# Altium footprint library ICs And Semiconductors SMD.PcbLib: 943 footprints (part 7 of 60)
Each footprint in its own frame and in the unit in brackets; x right, y up, seen from the top. Pads: shape width x height; smd on the part's side, far side on the other; paste and mask are expansions set on the pad; w line width, h text height; cw(c..) or ccw(c..) is an arc to the next point about the centre after c.
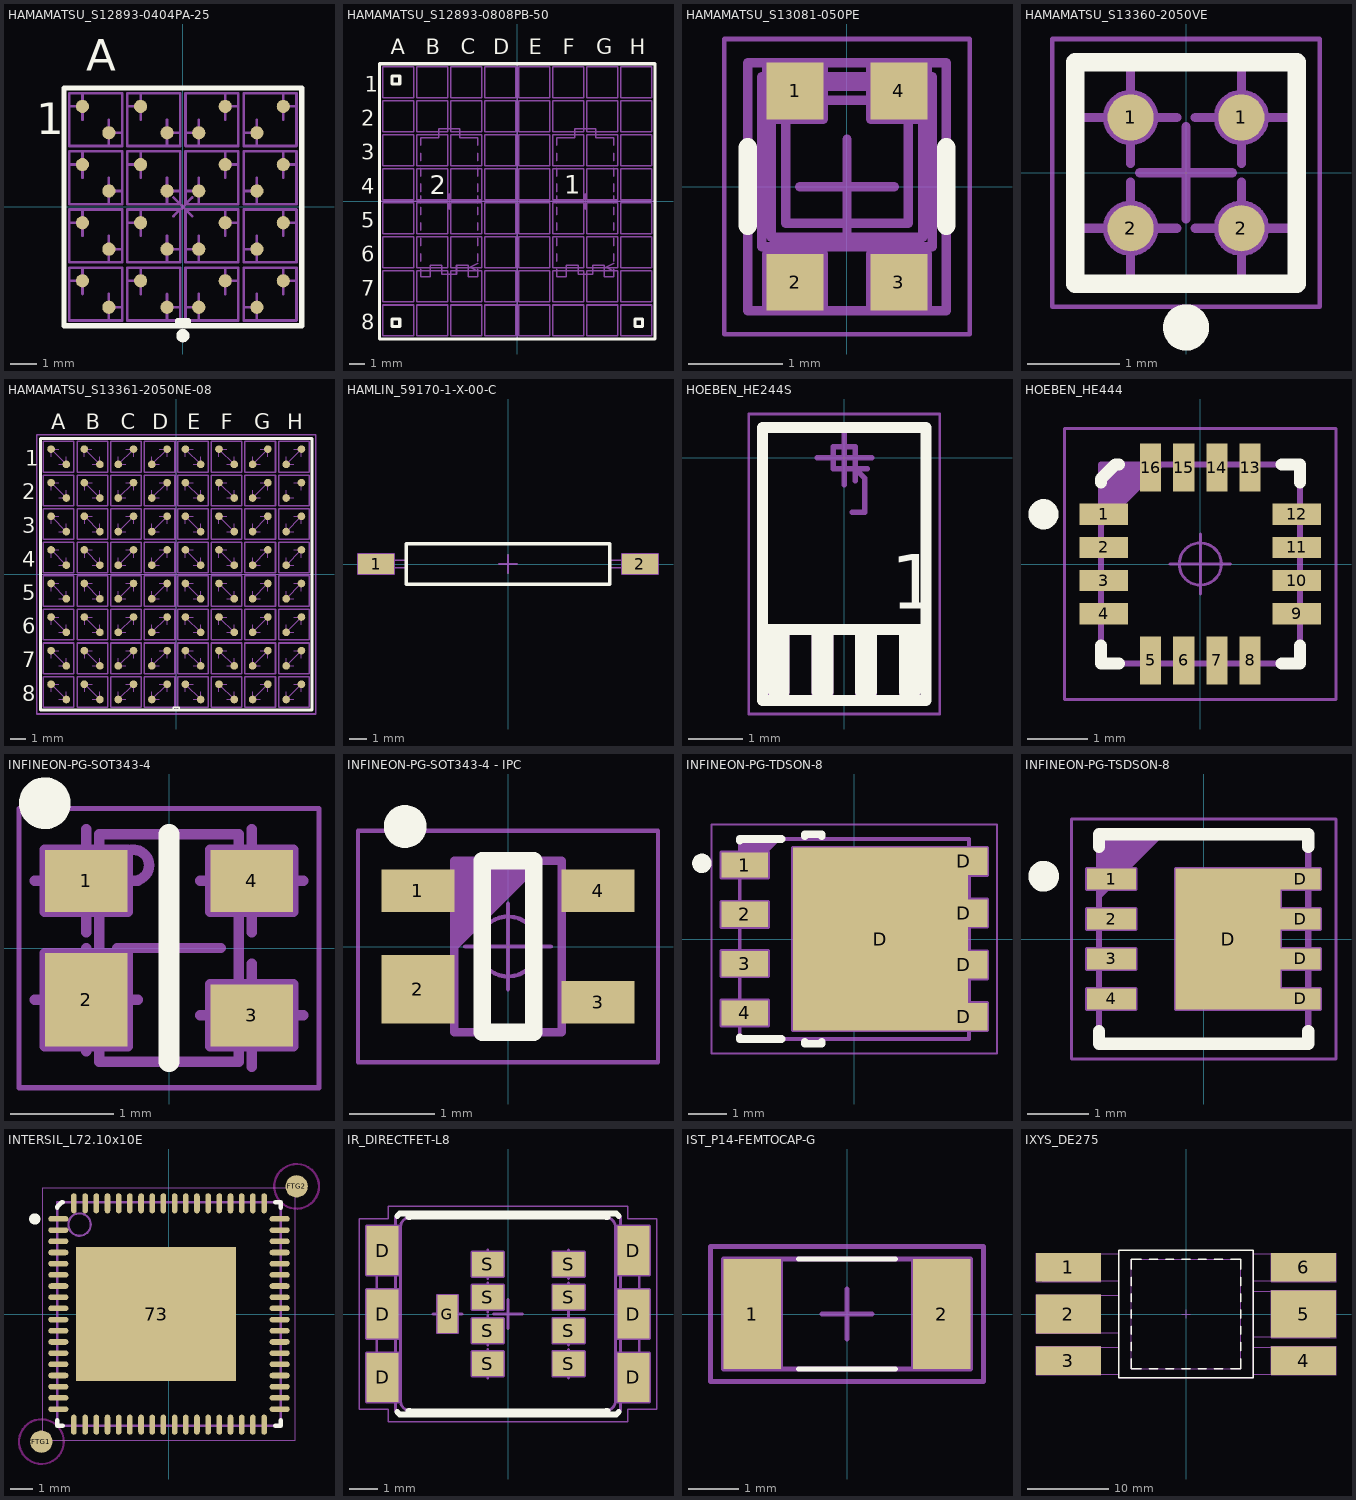
[diagram p6: the footprints below, top view; thin cyan lines are the x and y axes]

## HAMAMATSU_S12893-0404PA-25 [mm] "2X2mm, 16 Channel (4x4) TSV MPPC (Multi-Pixel Photon Counter), Body 9 x 9 x 1.55mm"
height 1.55
pads (32):
  round 0.5 smd: AA1(-3.8,3.8) AA2(-3.8,1.6) AA3(-3.8,-0.6) AA4(-3.8,-2.8) AB1(-1.6,3.8) AB2(-1.6,1.6) AB3(-1.6,-0.6) AB4(-1.6,-2.8) AC1(1.6,3.8) AC2(1.6,1.6) AC3(1.6,-0.6) AC4(1.6,-2.8) AD1(3.8,3.8) AD2(3.8,1.6) AD3(3.8,-0.6) AD4(3.8,-2.8) KA1(-2.8,2.8) KA2(-2.8,0.6) KA3(-2.8,-1.6) KA4(-2.8,-3.8) KB1(-0.6,2.8) KB2(-0.6,0.6) KB3(-0.6,-1.6) KB4(-0.6,-3.8) KC1(0.6,2.8) KC2(0.6,0.6) KC3(0.6,-1.6) KC4(0.6,-3.8) KD1(2.8,2.8) KD2(2.8,0.6) KD3(2.8,-1.6) KD4(2.8,-3.8)
Top Overlay:
  circle w0.25: c0,-4.875 r0.125
  lines w0.2: -0.2,-4.4 0.2,-4.4 ; -4.5,-4.5 4.5,-4.5 4.5,4.5 -4.5,4.5 -4.5,-4.5 ; -0.2,-4.5 0.2,-4.5 0.2,-4.3 -0.2,-4.3 -0.2,-4.5
  text "1" at -5.55,2.75 h1.2
  text "A" at -3.665,5.15 h1.2
Mechanical 8:
  lines w0.1: -4.3,-2.8 -3.8,-2.8 ; -4.3,-0.6 -3.8,-0.6 ; -4.3,1.6 -3.8,1.6 ; -4.3,3.8 -3.8,3.8 ; -3.8,-3.3 -3.8,-2.8 ; -3.8,-2.3 -3.8,-2.8 ; -3.8,-1.1 -3.8,-0.6 ; -3.8,-0.1 -3.8,-0.6 ; -3.8,1.1 -3.8,1.6 ; -3.8,2.1 -3.8,1.6 ; -3.8,3.3 -3.8,3.8 ; -3.8,4.3 -3.8,3.8 ; -2.8,-4.3 -2.8,-3.8 ; -2.8,-3.3 -2.8,-3.8 ; -2.8,-2.1 -2.8,-1.6 ; -2.8,-1.1 -2.8,-1.6 ; -2.8,0.1 -2.8,0.6 ; -2.8,1.1 -2.8,0.6 ; -2.8,2.3 -2.8,2.8 ; -2.8,3.3 -2.8,2.8 ; -2.3,-3.8 -2.8,-3.8 ; -2.3,-1.6 -2.8,-1.6 ; -2.3,0.6 -2.8,0.6 ; -2.3,2.8 -2.8,2.8 ; -2.1,-2.8 -1.6,-2.8 ; -2.1,-0.6 -1.6,-0.6 ; -2.1,1.6 -1.6,1.6 ; -2.1,3.8 -1.6,3.8 ; -1.6,-3.3 -1.6,-2.8 ; -1.6,-2.3 -1.6,-2.8 ; -1.6,-1.1 -1.6,-0.6 ; -1.6,-0.1 -1.6,-0.6 ; -1.6,1.1 -1.6,1.6 ; -1.6,2.1 -1.6,1.6 ; -1.6,3.3 -1.6,3.8 ; -1.6,4.3 -1.6,3.8 ; -0.6,-4.3 -0.6,-3.8 ; -0.6,-3.3 -0.6,-3.8 ; -0.6,-2.1 -0.6,-1.6 ; -0.6,-1.1 -0.6,-1.6 ; -0.6,0.1 -0.6,0.6 ; -0.6,1.1 -0.6,0.6 ; -0.6,2.3 -0.6,2.8 ; -0.6,3.3 -0.6,2.8 ; -0.354,-0.354 0,0 ; -0.354,0.354 0,0 ; -0.1,-3.8 -0.6,-3.8 ; -0.1,-1.6 -0.6,-1.6 ; -0.1,0.6 -0.6,0.6 ; -0.1,2.8 -0.6,2.8 ; 0.1,-3.8 0.6,-3.8 ; 0.1,-1.6 0.6,-1.6 ; 0.1,0.6 0.6,0.6 ; 0.1,2.8 0.6,2.8 ; 0.354,-0.354 0,0 ; 0.354,0.354 0,0 ; 0.6,-4.3 0.6,-3.8 ; 0.6,-3.3 0.6,-3.8 ; 0.6,-2.1 0.6,-1.6 ; 0.6,-1.1 0.6,-1.6 ; 0.6,0.1 0.6,0.6 ; 0.6,1.1 0.6,0.6 ; 0.6,2.3 0.6,2.8 ; 0.6,3.3 0.6,2.8 ; 1.6,-3.3 1.6,-2.8 ; 1.6,-2.3 1.6,-2.8 ; 1.6,-1.1 1.6,-0.6 ; 1.6,-0.1 1.6,-0.6 ; 1.6,1.1 1.6,1.6 ; 1.6,2.1 1.6,1.6 ; 1.6,3.3 1.6,3.8 ; 1.6,4.3 1.6,3.8 ; 2.1,-2.8 1.6,-2.8 ; 2.1,-0.6 1.6,-0.6 ; 2.1,1.6 1.6,1.6 ; 2.1,3.8 1.6,3.8 ; 2.3,-3.8 2.8,-3.8 ; 2.3,-1.6 2.8,-1.6 ; 2.3,0.6 2.8,0.6 ; 2.3,2.8 2.8,2.8 ; 2.8,-4.3 2.8,-3.8 ; 2.8,-3.3 2.8,-3.8 ; 2.8,-2.1 2.8,-1.6 ; 2.8,-1.1 2.8,-1.6 ; 2.8,0.1 2.8,0.6 ; 2.8,1.1 2.8,0.6 ; 2.8,2.3 2.8,2.8 ; 2.8,3.3 2.8,2.8 ; 3.8,-3.3 3.8,-2.8 ; 3.8,-2.3 3.8,-2.8 ; 3.8,-1.1 3.8,-0.6 ; 3.8,-0.1 3.8,-0.6 ; 3.8,1.1 3.8,1.6 ; 3.8,2.1 3.8,1.6 ; 3.8,3.3 3.8,3.8 ; 3.8,4.3 3.8,3.8 ; 4.3,-2.8 3.8,-2.8 ; 4.3,-0.6 3.8,-0.6 ; 4.3,1.6 3.8,1.6 ; 4.3,3.8 3.8,3.8
  text "K(A-1)" at -4.211,2.7 h0.2
  text "A(A-1)" at -3.4,3.7 h0.2
  text "K(B-1)" at -1.991,2.7 h0.2
  text "A(B-1)" at -1.2,3.7 h0.2
  text "K(C-1)" at 1.029,2.7 h0.2
  text "A(C-1)" at 0.158,3.7 h0.2
  text "K(D-1)" at 3.229,2.7 h0.2
  text "A(D-1)" at 2.338,3.7 h0.2
  text "K(A-2)" at -4.251,0.5 h0.2
  text "A(A-2)" at -3.4,1.5 h0.2
  text "K(B-2)" at -2.031,0.5 h0.2
  text "A(B-2)" at -1.2,1.5 h0.2
  text "K(C-2)" at 1.029,0.5 h0.2
  text "A(C-2)" at 0.118,1.5 h0.2
  text "K(D-2)" at 3.229,0.5 h0.2
  text "A(D-2)" at 2.298,1.5 h0.2
  text "K(A-3)" at -4.251,-1.7 h0.2
  text "A(A-3)" at -3.4,-0.7 h0.2
  text "K(B-3)" at -2.031,-1.7 h0.2
  text "A(B-3)" at -1.2,-0.7 h0.2
  text "K(C-3)" at 1.029,-1.7 h0.2
  text "A(C-3)" at 0.118,-0.7 h0.2
  text "K(D-3)" at 3.229,-1.7 h0.2
  text "A(D-3)" at 2.298,-0.7 h0.2
  text "K(A-4)" at -4.271,-3.9 h0.2
  text "A(A-4)" at -3.4,-2.9 h0.2
  text "K(B-4)" at -2.051,-3.9 h0.2
  text "A(B-4)" at -1.2,-2.9 h0.2
  text "K(C-4)" at 1.029,-3.9 h0.2
  text "A(C-4)" at 0.098,-2.9 h0.2
  text "K(D-4)" at 3.229,-3.9 h0.2
  text "A(D-4)" at 2.278,-2.9 h0.2
Mechanical 14:
  lines w0.1: -0.2,-4.4 0.2,-4.4 ; -4.5,-4.5 4.5,-4.5 4.5,4.5 -4.5,4.5 -4.5,-4.5 ; -4.3,-4.3 -4.3,-2.3 -2.3,-2.3 -2.3,-4.3 -4.3,-4.3 ; -4.3,-2.1 -4.3,-0.1 -2.3,-0.1 -2.3,-2.1 -4.3,-2.1 ; -4.3,0.1 -4.3,2.1 -2.3,2.1 -2.3,0.1 -4.3,0.1 ; -4.3,2.3 -4.3,4.3 -2.3,4.3 -2.3,2.3 -4.3,2.3 ; -2.1,-4.3 -2.1,-2.3 -0.1,-2.3 -0.1,-4.3 -2.1,-4.3 ; -2.1,-2.1 -2.1,-0.1 -0.1,-0.1 -0.1,-2.1 -2.1,-2.1 ; -2.1,0.1 -2.1,2.1 -0.1,2.1 -0.1,0.1 -2.1,0.1 ; -2.1,2.3 -2.1,4.3 -0.1,4.3 -0.1,2.3 -2.1,2.3 ; -0.2,-4.5 0.2,-4.5 0.2,-4.3 -0.2,-4.3 -0.2,-4.5 ; 0.1,-4.3 0.1,-2.3 2.1,-2.3 2.1,-4.3 0.1,-4.3 ; 0.1,-2.1 0.1,-0.1 2.1,-0.1 2.1,-2.1 0.1,-2.1 ; 0.1,0.1 0.1,2.1 2.1,2.1 2.1,0.1 0.1,0.1 ; 0.1,2.3 0.1,4.3 2.1,4.3 2.1,2.3 0.1,2.3 ; 2.3,-4.3 2.3,-2.3 4.3,-2.3 4.3,-4.3 2.3,-4.3 ; 2.3,-2.1 2.3,-0.1 4.3,-0.1 4.3,-2.1 2.3,-2.1 ; 2.3,0.1 2.3,2.1 4.3,2.1 4.3,0.1 2.3,0.1 ; 2.3,2.3 2.3,4.3 4.3,4.3 4.3,2.3 2.3,2.3
  text "1" at -5.55,2.75 h1.2
  text "A" at -3.665,5.15 h1.2
3D body "HAMAMATSU_S12893-0404PA-25_Part2.stp": height 1.55, standoff 1.15, extent -4.5,-4.5 4.5,4.5
3D body "HAMAMATSU_S12893-0404PA-25_Part1.stp": height 1.45, standoff 0, extent -4.5,-4.5 4.5,4.5

## HAMAMATSU_S12893-0808PB-50 [mm] "2x2mm2, 64 Channel (8x8) TSV MPPC (Multi-Pixel Photon Counter), Body 17.8 x 17.8 x 1.55mm"
height 4.43
Top Overlay:
  lines w0.2: -8.9,-8.9 -8.9,8.9 8.9,8.9 8.9,-8.9 -8.9,-8.9 ; -8.1,-8.1 -7.6,-8.1 -7.6,-7.6 -8.1,-7.6 -8.1,-8.1 ; -8.1,7.6 -8.1,8.1 -7.6,8.1 -7.6,7.6 -8.1,7.6 ; 7.6,-8.1 7.6,-7.6 8.1,-7.6 8.1,-8.1 7.6,-8.1
  text "A" at -8.19,9.5 h1
  text "B" at -5.93,9.5 h1
  text "C" at -3.642,9.5 h1
  text "D" at -1.564,9.5 h1
  text "E" at 0.73,9.5 h1
  text "F" at 2.93,9.5 h1
  text "G" at 5.101,9.5 h1
  text "H" at 7.27,9.5 h1
  text "1" at -9.875,7.1 h1
  text "2" at -10.1,4.9 h1
  text "3" at -10.1,2.7 h1
  text "4" at -10.1,0.5 h1
  text "5" at -10.1,-1.7 h1
  text "6" at -10.1,-3.9 h1
  text "7" at -10.1,-6.1 h1
  text "8" at -10.1,-8.3 h1
  text "1" at 3.025,0.5 h1.2
  text "2" at -5.65,0.475 h1.2
Mechanical 8:
  lines w0.1: -8.9,0 0,0 ; -4.9,0 -4.4,0 ; -4.4,-0.5 -4.4,0 ; -4.4,0.5 -4.4,0 ; -3.9,0 -4.4,0 ; 0,-8.9 0,0 ; 0,8.9 0,0 ; 3.9,0 4.4,0 ; 4.4,-0.5 4.4,0 ; 4.4,0.5 4.4,0 ; 4.9,0 4.4,0 ; 8.9,0 0,0
Mechanical 14:
  drawing of 344 lines, arcs and shapes, not listed
  text "A" at -8.19,9.5 h1
  text "B" at -5.93,9.5 h1
  text "C" at -3.642,9.5 h1
  text "D" at -1.564,9.5 h1
  text "E" at 0.73,9.5 h1
  text "F" at 2.93,9.5 h1
  text "G" at 5.101,9.5 h1
  text "H" at 7.27,9.5 h1
  text "1" at -9.875,7.1 h1
  text "2" at -10.1,4.9 h1
  text "3" at -10.1,2.7 h1
  text "4" at -10.1,0.5 h1
  text "5" at -10.1,-1.7 h1
  text "6" at -10.1,-3.9 h1
  text "7" at -10.1,-6.1 h1
  text "8" at -10.1,-8.3 h1
  text "1" at 3.025,0.5 h1.2
  text "2" at -5.65,0.475 h1.2
3D body "HAMAMATSU_S12893-0808PB-50_Part2.stp": height 5.45, standoff 5.05, extent -8.9,-8.9 8.9,8.9
3D body "HAMAMATSU_S12893-0808PB-50_Part1.stp": height 5.35, standoff 1.02, extent -8.9,-8.9 8.9,8.9

## HAMAMATSU_S13081-050PE [mm] "1.3 x 1.3mm2, 50µm Microcell Type, SMD MPPC (Multi-Pixel Photon Counter, Body 2.1mm x mm X 2.625mm"
height 1
pads (4):
  rect 0.6x0.6 smd: 1(-0.55,1.012) 2(-0.55,-1.012) 3(0.55,-1.012) 4(0.55,1.012)
Top Overlay:
  lines w0.2: -1.05,-0.413 -1.05,0.413 ; 1.05,-0.413 1.05,0.413
Mechanical 8:
  lines w0.1: -0.5,0 0,0 ; 0,-0.5 0,0 ; 0,0.5 0,0 ; 0.5,0 0,0 ; -0.85,-1.313 -0.55,-1.012 -0.25,-1.313 ; -0.85,-1.313 -0.85,-0.713 -0.25,-0.713 -0.25,-1.313 ; -0.85,-1.313 -0.25,-1.313 ; -0.85,1.313 -0.55,1.012 -0.25,1.313 ; -0.85,1.313 -0.85,0.713 -0.25,0.713 -0.25,1.313 ; -0.85,1.313 -0.25,1.313 ; 0.25,-1.313 0.55,-1.012 0.85,-1.313 ; 0.25,-1.313 0.25,-0.713 0.85,-0.713 0.85,-1.313 ; 0.25,-1.313 0.85,-1.313 ; 0.25,1.313 0.55,1.012 0.85,1.313 ; 0.25,1.313 0.25,0.713 0.85,0.713 0.85,1.313 ; 0.25,1.313 0.85,1.313
Mechanical 14:
  lines w0.1: -0.68,-1.042 -0.68,-0.637 ; -0.42,-1.042 -0.42,-0.637 ; -1.05,-1.313 -1.05,1.313 1.05,1.313 1.05,-1.313 -1.05,-1.313 ; -0.9,-0.637 0.9,-0.637 0.9,1.162 -0.9,1.162 -0.9,-0.637 ; -0.85,-1.313 cw(c-0.55,-1.313) -0.25,-1.313 -0.85,-1.313 ; -0.8,-0.537 0.8,-0.537 0.8,1.062 -0.8,1.062 -0.8,-0.537 ; -0.65,-0.387 0.65,-0.387 0.65,0.913 -0.65,0.913 -0.65,-0.387 ; 0.25,-1.313 cw(c0.55,-1.313) 0.85,-1.313 0.25,-1.313
Mechanical 15:
  lines w0.05: -1.3,-1.563 -1.3,1.563 1.3,1.563 1.3,-1.563 -1.3,-1.563
3D body "HAMAMATSU_S13081-050PE_Part1.stp": height 0.7, standoff 0, extent -1.05,-1.312 1.05,1.313
3D body "HAMAMATSU_S13081-050PE_Part2.stp": height 1, standoff 0.4, extent -1.05,-1.312 1.05,1.313

## HAMAMATSU_S13360-2050VE [mm] "2X2mm, 1584 Pixels, MPPC (Multi-Pixel Photon Counter)"
height 1.55
pads (4):
  round 0.5 smd: 1(-0.6,0.6) 1(0.6,0.6) 2(-0.6,-0.6) 2(0.6,-0.6)
Top Overlay:
  circle w0.25: c0,-1.675 r0.125
  lines w0.2: -1.2,-1.2 1.2,-1.2 1.2,1.2 -1.2,1.2 -1.2,-1.2
Internal Plane 14:
  lines w0.1: -1.2,-1.2 1.2,-1.2 1.2,1.2 -1.2,1.2 -1.2,-1.2 ; -1,-1 1,-1 1,1 -1,1 -1,-1 ; -0.25,-1.2 0.25,-1.2 0.25,-1 -0.25,-1 -0.25,-1.2
Mechanical 8:
  circle w0.1: c-0.6,0.6 r0.25
  circle w0.1: c0.6,0.6 r0.25
  circle w0.1: c-0.6,-0.6 r0.25
  circle w0.1: c0.6,-0.6 r0.25
  lines w0.1: -1.1,-0.6 -0.6,-0.6 ; -1.1,0.6 -0.6,0.6 ; -0.6,-1.1 -0.6,-0.6 ; -0.6,-0.1 -0.6,-0.6 ; -0.6,0.1 -0.6,0.6 ; -0.6,1.1 -0.6,0.6 ; -0.5,0 0,0 ; -0.1,-0.6 -0.6,-0.6 ; -0.1,0.6 -0.6,0.6 ; 0,-0.5 0,0 ; 0,0.5 0,0 ; 0.1,-0.6 0.6,-0.6 ; 0.1,0.6 0.6,0.6 ; 0.5,0 0,0 ; 0.6,-1.1 0.6,-0.6 ; 0.6,-0.1 0.6,-0.6 ; 0.6,0.1 0.6,0.6 ; 0.6,1.1 0.6,0.6 ; 1.1,-0.6 0.6,-0.6 ; 1.1,0.6 0.6,0.6
Mechanical 15:
  lines w0.05: -1.45,-1.45 1.45,-1.45 1.45,1.45 -1.45,1.45 -1.45,-1.45
3D body "HAMAMATSU_S13360-2050VE_part1.stp": height 1.45, standoff 0, extent -1.2,-1.2 1.2,1.2
3D body "HAMAMATSU_S13360-2050VE_part2.stp": height 1.55, standoff 1, extent -1.2,-1.2 1.2,1.2

## HAMAMATSU_S13361-2050NE-08 [mm] "2x2mm, 64 Channel (8x8) TSV MPPC (Multi-Pixel Photon Counter), Body 17.8 x 17.8 x 1.55mm"
height 1.55
pads (128):
  round 0.5 smd: AA1(-8.2,8.2) AA2(-8.2,6) AA3(-8.2,3.8) AA4(-8.2,1.6) AA5(-8.2,-0.6) AA6(-8.2,-2.8) AA7(-8.2,-5) AA8(-8.2,-7.2) AB1(-6.023,8.2) AB2(-6.023,6) AB3(-6.023,3.8) AB4(-6.023,1.6) AB5(-6.023,-0.6) AB6(-6.023,-2.8) AB7(-6.023,-5) AB8(-6.023,-7.2) AC1(-2.8,8.2) AC2(-2.8,6) AC3(-2.8,3.8) AC4(-2.8,1.6) AC5(-2.8,-0.6) AC6(-2.8,-2.8) AC7(-2.8,-5) AC8(-2.8,-7.2) AD1(-0.6,8.2) AD2(-0.6,6) AD3(-0.6,3.8) AD4(-0.6,1.6) AD5(-0.6,-0.6) AD6(-0.6,-2.8) AD7(-0.6,-5) AD8(-0.6,-7.2) AE1(0.6,8.2) AE2(0.6,6) AE3(0.6,3.8) AE4(0.6,1.6) AE5(0.6,-0.6) AE6(0.6,-2.8) AE7(0.6,-5) AE8(0.6,-7.2) AF1(2.8,8.2) AF2(2.8,6) AF3(2.8,3.8) AF4(2.8,1.6) AF5(2.8,-0.6) AF6(2.8,-2.8) AF7(2.8,-5) AF8(2.8,-7.2) AG1(6,8.2) AG2(6,6) AG3(6,3.8) AG4(6,1.6) AG5(6,-0.6) AG6(6,-2.8) AG7(6,-5) AG8(6,-7.2) AH1(8.2,8.2) AH2(8.2,6) AH3(8.2,3.8) AH4(8.2,1.6) AH5(8.2,-0.6) AH6(8.2,-2.8) AH7(8.2,-5) AH8(8.2,-7.2) KA1(-7.2,7.2) KA2(-7.2,5) KA3(-7.2,2.8) KA4(-7.2,0.6) KA5(-7.2,-1.6) KA6(-7.2,-3.8) KA7(-7.2,-6) KA8(-7.2,-8.2) KB1(-5,7.2) KB2(-5,5) KB3(-5,2.8) KB4(-5,0.6) KB5(-5,-1.6) KB6(-5,-3.8) KB7(-5,-6) KB8(-5,-8.2) KC1(-3.8,7.2) KC2(-3.8,5) KC3(-3.8,2.8) KC4(-3.8,0.6) KC5(-3.8,-1.6) KC6(-3.8,-3.8) KC7(-3.8,-6) KC8(-3.8,-8.2) KD1(-1.6,7.2) KD2(-1.6,5) KD3(-1.6,2.8) KD4(-1.6,0.6) KD5(-1.6,-1.6) KD6(-1.6,-3.8) KD7(-1.6,-6) KD8(-1.6,-8.2) KE1(1.6,7.2) KE2(1.6,5) KE3(1.6,2.8) KE4(1.6,0.6) KE5(1.6,-1.6) KE6(1.6,-3.8) KE7(1.6,-6) KE8(1.6,-8.2) KF1(3.8,7.2) KF2(3.8,5) KF3(3.8,2.8) KF4(3.8,0.6) KF5(3.8,-1.6) KF6(3.8,-3.8) KF7(3.8,-6) KF8(3.8,-8.2) KG1(5,7.2) KG2(5,5) KG3(5,2.8) KG4(5,0.6) KG5(5,-1.6) KG6(5,-3.8) KG7(5,-6) KG8(5,-8.2) KH1(7.2,7.2) KH2(7.2,5) KH3(7.2,2.8) KH4(7.2,0.6) KH5(7.2,-1.6) KH6(7.2,-3.8) KH7(7.2,-6) KH8(7.2,-8.2)
Top Overlay:
  lines w0.1: -0.2,-8.9 -0.2,-8.7 0.2,-8.7 0.2,-8.9
  lines w0.2: -8.9,-8.9 8.9,-8.9 8.9,8.9 -8.9,8.9 -8.9,-8.9
  text "8" at -10.1,-8.3 h1
  text "7" at -10.1,-6.1 h1
  text "6" at -10.1,-3.9 h1
  text "5" at -10.1,-1.7 h1
  text "4" at -10.1,0.5 h1
  text "3" at -10.1,2.7 h1
  text "2" at -10.1,4.9 h1
  text "1" at -9.875,7.1 h1
  text "H" at 7.27,9.5 h1
  text "G" at 5.101,9.5 h1
  text "F" at 2.93,9.5 h1
  text "E" at 0.73,9.5 h1
  text "D" at -1.564,9.5 h1
  text "C" at -3.642,9.5 h1
  text "B" at -5.93,9.5 h1
  text "A" at -8.19,9.5 h1
Mechanical 8:
  drawing of 323 lines, arcs and shapes, not listed
  text "A(D-5)" at -2.225,-0.75 h0.2
  text "K(D-5)" at -1.1,-1.75 h0.2
  text "A(A-5)" at -8.855,-1.75 h0.2
  text "K(A-5)" at -7.7,-0.75 h0.2
  text "A(D-6)" at -2.225,-2.95 h0.2
  text "K(D-6)" at -1.1,-3.95 h0.2
  text "A(A-6)" at -8.855,-3.95 h0.2
  text "K(A-6)" at -7.7,-2.95 h0.2
  text "A(A-7)" at -8.855,-6.15 h0.2
  text "K(A-7)" at -7.7,-5.15 h0.2
  text "A(A-8)" at -8.855,-8.35 h0.2
  text "K(A-8)" at -7.7,-7.35 h0.2
  text "A(D-7)" at -2.225,-5.15 h0.2
  text "K(D-7)" at -1.1,-6.15 h0.2
  text "A(D-8)" at -2.225,-7.35 h0.2
  text "K(D-8)" at -1.1,-8.35 h0.2
  text "A(C-5)" at -4.395,-0.75 h0.2
  text "K(C-5)" at -3.3,-1.75 h0.2
  text "A(C-8)" at -4.395,-7.35 h0.2
  text "K(C-8)" at -3.3,-8.35 h0.2
  text "A(B-8)" at -6.625,-8.35 h0.2
  text "K(B-8)" at -5.5,-7.35 h0.2
  text "A(B-5)" at -6.625,-1.75 h0.2
  text "K(B-5)" at -5.5,-0.75 h0.2
  text "A(C-6)" at -4.395,-2.97 h0.2
  text "K(C-6)" at -3.3,-3.97 h0.2
  text "A(C-7)" at -4.395,-5.17 h0.2
  text "K(C-7)" at -3.3,-6.17 h0.2
  text "A(B-6)" at -6.625,-3.95 h0.2
  text "K(B-6)" at -5.5,-2.95 h0.2
  text "A(B-7)" at -6.625,-6.15 h0.2
  text "K(B-7)" at -5.5,-5.15 h0.2
  text "A(D-1)" at -2.165,8.05 h0.2
  text "K(D-1)" at -1.1,7.05 h0.2
  text "A(A-1)" at -8.795,7.05 h0.2
  text "K(A-1)" at -7.7,8.05 h0.2
  text "A(D-2)" at -2.225,5.85 h0.2
  text "K(D-2)" at -1.1,4.85 h0.2
  text "A(A-2)" at -8.855,4.85 h0.2
  text "K(A-2)" at -7.7,5.85 h0.2
  text "A(A-3)" at -8.855,2.65 h0.2
  text "K(A-3)" at -7.7,3.65 h0.2
  text "A(A-4)" at -8.885,0.45 h0.2
  text "K(A-4)" at -7.7,1.45 h0.2
  text "A(D-3)" at -2.225,3.65 h0.2
  text "K(D-3)" at -1.1,2.65 h0.2
  text "A(D-4)" at -2.255,1.45 h0.2
  text "K(D-4)" at -1.1,0.45 h0.2
  text "A(C-1)" at -4.335,8.05 h0.2
  text "K(C-1)" at -3.3,7.05 h0.2
  text "A(C-4)" at -4.425,1.45 h0.2
  text "K(C-4)" at -3.3,0.45 h0.2
  text "A(B-4)" at -6.655,0.45 h0.2
  text "K(B-4)" at -5.5,1.45 h0.2
  text "A(B-1)" at -6.565,7.05 h0.2
  text "K(B-1)" at -5.5,8.05 h0.2
  text "A(C-2)" at -4.395,5.83 h0.2
  text "K(C-2)" at -3.3,4.83 h0.2
  text "A(C-3)" at -4.395,3.63 h0.2
  text "K(C-3)" at -3.3,2.63 h0.2
  text "A(B-2)" at -6.625,4.85 h0.2
  text "K(B-2)" at -5.5,5.85 h0.2
  text "A(B-3)" at -6.625,2.65 h0.2
  text "K(B-3)" at -5.5,3.65 h0.2
  text "A(H-1)" at 6.635,8.05 h0.2
  text "K(H-1)" at 7.7,7.05 h0.2
  text "A(E-1)" at 0.065,7.05 h0.2
  text "K(E-1)" at 1.1,8.05 h0.2
  text "A(H-2)" at 6.575,5.85 h0.2
  text "K(H-2)" at 7.7,4.85 h0.2
  text "A(E-2)" at 0.005,4.85 h0.2
  text "K(E-2)" at 1.1,5.85 h0.2
  text "A(E-3)" at 0.005,2.65 h0.2
  text "K(E-3)" at 1.1,3.65 h0.2
  text "A(E-4)" at -0.025,0.45 h0.2
  text "K(E-4)" at 1.1,1.45 h0.2
  text "A(H-3)" at 6.575,3.65 h0.2
  text "K(H-3)" at 7.7,2.65 h0.2
  text "A(H-4)" at 6.545,1.45 h0.2
  text "K(H-4)" at 7.7,0.45 h0.2
  text "A(G-1)" at 4.435,8.05 h0.2
  text "K(G-1)" at 5.5,7.05 h0.2
  text "A(G-4)" at 4.345,1.45 h0.2
  text "K(G-4)" at 5.5,0.45 h0.2
  text "A(F-4)" at 2.175,0.45 h0.2
  text "K(F-4)" at 3.3,1.45 h0.2
  text "A(F-1)" at 2.265,7.05 h0.2
  text "K(F-1)" at 3.3,8.05 h0.2
  text "A(G-2)" at 4.375,5.83 h0.2
  text "K(G-2)" at 5.5,4.83 h0.2
  text "A(G-3)" at 4.375,3.63 h0.2
  text "K(G-3)" at 5.5,2.63 h0.2
  text "A(F-2)" at 2.205,4.85 h0.2
  text "K(F-2)" at 3.3,5.85 h0.2
  text "A(F-3)" at 2.205,2.65 h0.2
  text "K(F-3)" at 3.3,3.65 h0.2
  text "A(H-5)" at 6.575,-0.75 h0.2
  text "K(H-5)" at 7.7,-1.75 h0.2
  text "A(E-5)" at 0.005,-1.75 h0.2
  text "K(E-5)" at 1.1,-0.75 h0.2
  text "A(H-6)" at 6.575,-2.95 h0.2
  text "K(H-6)" at 7.7,-3.95 h0.2
  text "A(E-6)" at 0.005,-3.95 h0.2
  text "K(E-6)" at 1.1,-2.95 h0.2
  text "A(E-7)" at 0.005,-6.15 h0.2
  text "K(E-7)" at 1.1,-5.15 h0.2
  text "A(E-8)" at 0.005,-8.35 h0.2
  text "K(E-8)" at 1.1,-7.35 h0.2
  text "A(H-7)" at 6.575,-5.15 h0.2
  text "K(H-7)" at 7.7,-6.15 h0.2
  text "A(H-8)" at 6.575,-7.35 h0.2
  text "K(H-8)" at 7.7,-8.35 h0.2
  text "A(G-5)" at 4.375,-0.75 h0.2
  text "K(G-5)" at 5.5,-1.75 h0.2
  text "A(G-8)" at 4.375,-7.35 h0.2
  text "K(G-8)" at 5.5,-8.35 h0.2
  text "A(F-8)" at 2.205,-8.35 h0.2
  text "K(F-8)" at 3.3,-7.35 h0.2
  text "A(F-5)" at 2.205,-1.75 h0.2
  text "K(F-5)" at 3.3,-0.75 h0.2
  text "A(G-6)" at 4.375,-2.97 h0.2
  text "K(G-6)" at 5.5,-3.97 h0.2
  text "A(G-7)" at 4.375,-5.17 h0.2
  text "K(G-7)" at 5.5,-6.17 h0.2
  text "A(F-6)" at 2.205,-3.95 h0.2
  text "K(F-6)" at 3.3,-2.95 h0.2
  text "A(F-7)" at 2.205,-6.15 h0.2
  text "K(F-7)" at 3.3,-5.15 h0.2
Mechanical 14:
  drawing of 263 lines, arcs and shapes, not listed
  text "8" at -10.1,-8.3 h1
  text "7" at -10.1,-6.1 h1
  text "6" at -10.1,-3.9 h1
  text "5" at -10.1,-1.7 h1
  text "4" at -10.1,0.5 h1
  text "3" at -10.1,2.7 h1
  text "2" at -10.1,4.9 h1